# Altium footprint library Connector.PcbLib: 231 footprints (part 10 of 15)
Each footprint in its own frame and in the unit in brackets; x right, y up, seen from the top. Pads: shape width x height; smd on the part's side, far side on the other; paste and mask are expansions set on the pad; w line width, h text height; cw(c..) or ccw(c..) is an arc to the next point about the centre after c.
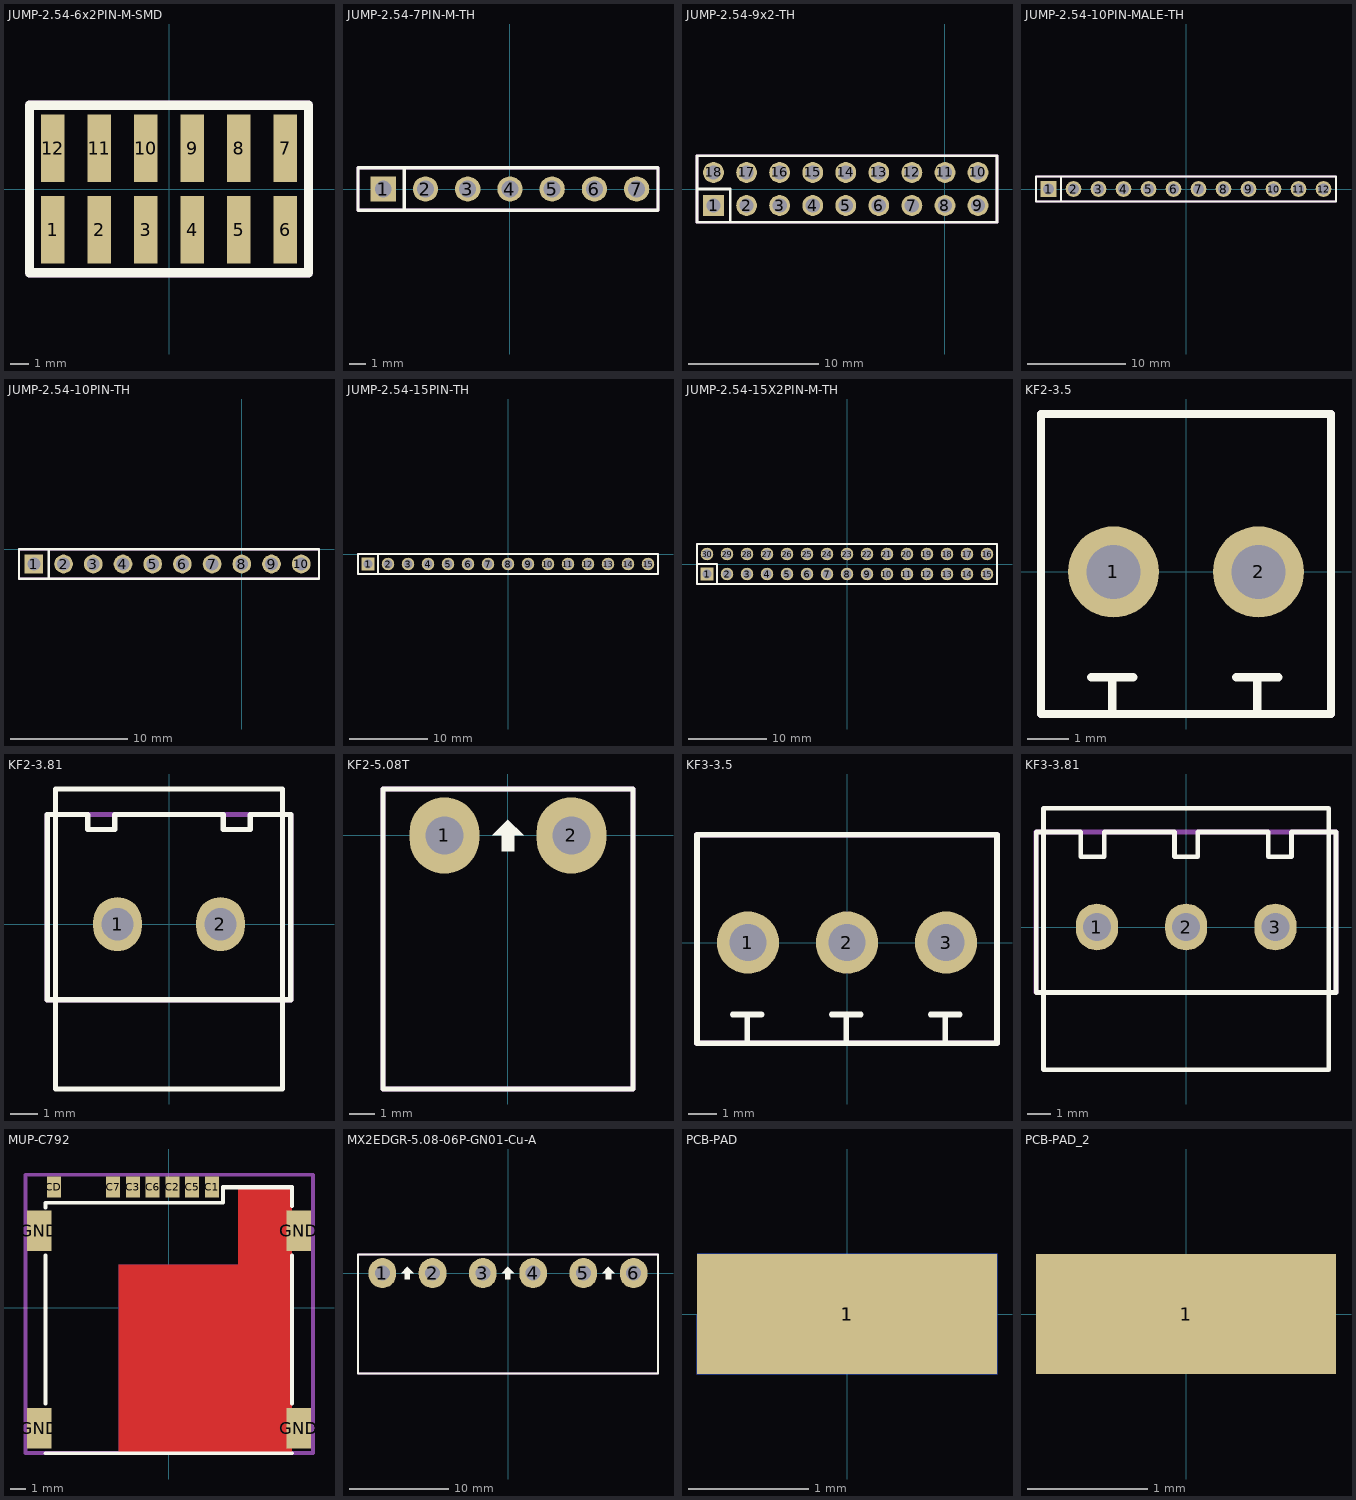
[diagram p9: the footprints below, top view; thin cyan lines are the x and y axes]

## JUMP-2.54-6x2PIN-M-SMD [mm]
pads (12):
  rect 1.27x3.68 smd: 1(-6.35,-2.22) 2(-3.81,-2.22) 3(-1.27,-2.22) 4(1.27,-2.22) 5(3.81,-2.22) 6(6.35,-2.22) 7(6.35,2.22) 8(3.81,2.22) 9(1.27,2.22) 10(-1.27,2.22) 11(-3.81,2.22) 12(-6.35,2.22)
Top Overlay:
  lines w0.5: -7.62,3.048 -7.62,4.572 7.62,4.572 7.62,-4.572 -7.62,-4.572 -7.62,3.493
Mechanical 13:
  lines w0.5: -7.62,3.048 -7.62,4.572 7.62,4.572 7.62,-4.572 -7.62,-4.572 -7.62,3.493
  text ".Designator" at -4.318,-0.508 h2
Mechanical 15:
  lines w0.5: -7.62,3.048 -7.62,4.572 7.62,4.572 7.62,-4.572 -7.62,-4.572 -7.62,3.493
  text ".Comment" at -3.048,-0.508 h2
3D body "015910120.stp": height 9.64, standoff -0.01, extent -7.62,-3.493 7.62,3.493

## JUMP-2.54-7PIN-M-TH [mm] "6 row, straight, gold plating"
height 8.5
pads (7):
  rect 1.52x1.52 hole 1.02: 1(-7.62,0)
  round 1.52 hole 1.02: 2(-5.08,0) 3(-2.54,0) 4(0,0) 5(2.54,0) 6(5.08,0) 7(7.62,0)
Top Overlay:
  lines w0.2: -6.35,-1.27 -6.35,1.27 ; -9.14,-1.27 -9.14,1.27 8.905,1.27 8.905,-1.27 -9.14,-1.27
Mechanical 13:
  lines w0.2: -9.14,-1.27 8.905,-1.27 8.905,1.27 -9.14,1.27 -9.14,-1.27
  text ".Designator" at -4.12,-0.25 h1.5
Mechanical 15:
  lines w0.2: -9.14,-1.27 8.905,-1.27 8.905,1.27 -9.14,1.27 -9.14,-1.27
  text ".Comment" at -4.12,-0.25 h1.5

## JUMP-2.54-9x2-TH [mm]
pads (18):
  rect 1.6x1.6 hole 1.1: 1(-17.78,-1.27)
  round 1.6 hole 1.1: 2(-15.24,-1.27) 3(-12.7,-1.27) 4(-10.16,-1.27) 5(-7.62,-1.27) 6(-5.08,-1.27) 7(-2.54,-1.27) 8(0,-1.27) 9(2.54,-1.27) 10(2.54,1.27) 11(0,1.27) 12(-2.54,1.27) 13(-5.08,1.27) 14(-7.62,1.27) 15(-10.16,1.27) 16(-12.7,1.27) 17(-15.24,1.27) 18(-17.78,1.27)
Top Overlay:
  lines w0.2: -19.05,0 -16.51,0 -16.51,-2.54 ; -19.05,-2.54 -19.05,2.54 4,2.54 4,-2.54 -19.05,-2.54
Mechanical 13:
  lines w0.2: -19.05,-2.54 4,-2.54 4,2.54 -19.05,2.54 -19.05,-2.54
  text ".Designator" at -3.81,-0.762 h2
Mechanical 15:
  lines w0.2: -19.05,-2.54 4,-2.54 4,2.54 -19.05,2.54 -19.05,-2.54
  text ".Comment" at -3.81,-0.508 h2

## JUMP-2.54-10PIN-MALE-TH [mm] "12 pins, 1 row, straight, gold plating"
height 8.54
pads (12):
  rect 1.6x1.6 hole 1.1: 1(-13.97,0)
  round 1.6 hole 1.1: 2(-11.43,0) 3(-8.89,0) 4(-6.35,0) 5(-3.81,0) 6(-1.27,0) 7(1.27,0) 8(3.81,0) 9(6.35,0) 10(8.89,0) 11(11.43,0) 12(13.97,0)
Top Overlay:
  lines w0.2: -12.7,-1.27 -12.7,1.27 ; -15.24,-1.27 -15.24,1.27 -13.335,1.27 15.24,1.27 15.24,-1.27 -15.24,-1.27
Mechanical 13:
  lines w0.2: -15.24,-1.27 15.24,-1.27 15.24,1.27 -13.335,1.27 -15.24,1.27 -15.24,-1.27
  text ".Designator" at -3.75,-0.25 h1.5
Mechanical 15:
  lines w0.2: -15.24,-1.27 15.24,-1.27 15.24,1.27 -13.335,1.27 -15.24,1.27 -15.24,-1.27
  text ".Comment" at -3.75,-0.25 h1.5
3D body "61301211121.stp": height 8.54, standoff -3, extent -15.24,-1.27 15.24,1.27

## JUMP-2.54-10PIN-TH [mm]
pads (10):
  rect 1.6x1.6 hole 1.1: 1(-17.78,-1.27)
  round 1.6 hole 1.1: 2(-15.24,-1.27) 3(-12.7,-1.27) 4(-10.16,-1.27) 5(-7.62,-1.27) 6(-5.08,-1.27) 7(-2.54,-1.27) 8(0,-1.27) 9(2.54,-1.27) 10(5.08,-1.27)
Top Overlay:
  lines w0.2: -16.51,-2.54 -16.51,0 -19.05,0 ; -19.05,0 6.6,0 6.6,-2.54 -19.05,-2.54 -19.05,0
Mechanical 13:
  lines w0.2: -19.05,-2.54 -19.05,0 6.6,0 6.6,-2.54 -19.05,-2.54
  text ".Designator" at -19.05,0 h2
Mechanical 15:
  lines w0.2: -19.05,-2.54 -19.05,0 6.6,0 6.6,-2.54 -19.05,-2.54
  text ".Comment" at -19,0.5 h2

## JUMP-2.54-15PIN-TH [mm]
pads (15):
  rect 1.6x1.6 hole 1.1: 1(-17.78,-1.27)
  round 1.6 hole 1.1: 2(-15.24,-1.27) 3(-12.7,-1.27) 4(-10.16,-1.27) 5(-7.62,-1.27) 6(-5.08,-1.27) 7(-2.54,-1.27) 8(0,-1.27) 9(2.54,-1.27) 10(5.08,-1.27) 11(7.62,-1.27) 12(10.16,-1.27) 13(12.7,-1.27) 14(15.24,-1.27) 15(17.78,-1.27)
Top Overlay:
  lines w0.2: -16.51,-2.54 -16.51,0 -19.05,0 ; -19.05,0 19.05,0 19.05,-2.54 -19.05,-2.54 -19.05,0
Mechanical 13:
  lines w0.2: -19.05,-2.54 -19.05,0 19.05,0 19.05,-2.54 -19.05,-2.54
  text ".Designator" at -3.81,-0.762 h2
Mechanical 15:
  lines w0.2: -19.05,-2.54 -19.05,0 19.05,0 19.05,-2.54 -19.05,-2.54
  text ".Comment" at -3.81,-0.508 h2

## JUMP-2.54-15X2PIN-M-TH [mm]
pads (30):
  rect 1.6x1.6 hole 1.1: 1(-17.78,-1.27)
  round 1.6 hole 1.1: 2(-15.24,-1.27) 3(-12.7,-1.27) 4(-10.16,-1.27) 5(-7.62,-1.27) 6(-5.08,-1.27) 7(-2.54,-1.27) 8(0,-1.27) 9(2.54,-1.27) 10(5.08,-1.27) 11(7.62,-1.27) 12(10.16,-1.27) 13(12.7,-1.27) 14(15.24,-1.27) 15(17.78,-1.27) 16(17.78,1.27) 17(15.24,1.27) 18(12.7,1.27) 19(10.16,1.27) 20(7.62,1.27) 21(5.08,1.27) 22(2.54,1.27) 23(0,1.27) 24(-2.54,1.27) 25(-5.08,1.27) 26(-7.62,1.27) 27(-10.16,1.27) 28(-12.7,1.27) 29(-15.24,1.27) 30(-17.78,1.27)
Top Overlay:
  lines w0.2: -19.05,0 -16.51,0 -16.51,-2.54 ; -19.05,-2.54 19.05,-2.54 19.05,2.54 -19.05,2.54 -19.05,-2.54
Mechanical 13:
  lines w0.2: -19.05,-2.54 -19.05,2.54 19.05,2.54 19.05,-2.54 -19.05,-2.54
  text ".Designator" at -3.81,-0.762 h2
Mechanical 15:
  lines w0.2: -19.05,-2.54 -19.05,2.54 19.05,2.54 19.05,-2.54 -19.05,-2.54
  text ".Comment" at -3.81,-0.508 h2
3D body "61303021121.stp": height 8.55, standoff -2.99, extent -19.05,-2.54 19.05,2.54

## KF2-3.5 [mm] "3,50mm - modular - blue - Horizontal wire entry - Pressure clamp - 8,4mm height - 02p"
height 8.4
pads (2):
  round 2.2 hole 1.3: 1(-1.75,0) 2(1.75,0)
Top Overlay:
  lines w0.2: -2.286,-2.54 -1.27,-2.54 ; -1.778,-3.429 -1.778,-2.54 ; 1.214,-2.54 2.23,-2.54 ; 1.722,-3.429 1.722,-2.54 ; -3.5,-3.429 -3.5,3.81 3.5,3.81 3.5,-3.429 -3.5,-3.429
Mechanical 13:
  lines w0.2: -3.5,-3.429 3.5,-3.429 3.5,3.81 -3.5,3.81 -3.5,-3.429
  text ".Designator" at -3.048,-0.381 h1.5
Mechanical 15:
  lines w0.2: -3.5,-3.429 3.5,-3.429 3.5,3.81 -3.5,3.81 -3.5,-3.429
  text ".Comment" at -2.794,-0.127 h1.5
3D body "393570002.stp": height 8.51, standoff -3.51, extent -3.556,-3.48 3.556,3.81

## KF2-3.81 [mm]
pads (2):
  oval 1.8x2 hole 1.2: 1(-1.905,0) 2(1.905,0)
Top Overlay:
  lines w0.2: -4.509,-2.8 4.509,-2.8 4.509,4.058 3,4.058 3,3.5 2,3.5 2,4.058 -2,4.058 -2,3.5 -3,3.5 -3,4.058 -4.509,4.058 -4.509,-2.8 ; -4.2,-6.1 4.2,-6.1 4.2,5 -4.2,5 -4.2,-6.1
Mechanical 13:
  lines w0.2: -4.509,-2.8 -4.509,4.058 4.509,4.058 4.509,-2.8 -4.509,-2.8
  text ".Designator" at -3.3,-0.3 h1.5
Mechanical 15:
  lines w0.2: -4.509,-2.8 -4.509,4.058 4.509,4.058 4.509,-2.8 -4.509,-2.8
  text ".Comment" at -3.3,-0.3 h1.5
3D body "395116002.stp": height 9.5, standoff -3.2, extent -4.509,-2.8 4.509,4.058
3D body "395105002.stp": height 19.51, standoff 3.51, extent -4.191,-6.1 4.191,5.076

## KF2-5.08T [mil] "Header 2, 2 pin, hight 300mil, Pin to Pin 200, Colour Green"
height 300
pads (2):
  oval 110x120 hole 60: 1(-100,0) 2(100,0)
Top Overlay:
  region: 0,25 -25,0 -10,0 -10,-25 10,-25 10,0 25,0
  lines w7.87: -196.7,-399.22 -196.7,73.22 197,73.22 197,-399.22 -196.7,-399.22
Mechanical 13:
  lines w7.87: -196.7,-399.22 197,-399.22 197,73.22 -196.7,73.22 -196.7,-399.22
Mechanical 15:
  lines w7.87: -196.7,-399.22 -196.7,73.22 197,73.22 197,-399.22 -196.7,-399.22
3D body "SW3dPS-5EHDR_2P.STEP": height 333.51, standoff -157.48, extent -196.7,-399.22 197,73.22

## KF3-3.5 [mm] "3,50mm - modular - blue - Horizontal wire entry - Pressure clamp - 8,4mm height - 03p"
height 8.4
pads (3):
  round 2.2 hole 1.3: 1(-3.5,0) 2(0,0) 3(3.5,0)
Top Overlay:
  lines w0.2: -4.036,-2.54 -3.02,-2.54 ; -3.528,-3.429 -3.528,-2.54 ; -0.536,-2.54 0.48,-2.54 ; -0.028,-3.429 -0.028,-2.54 ; 2.964,-2.54 3.98,-2.54 ; 3.472,-3.429 3.472,-2.54 ; -5.3,-3.556 5.3,-3.556 5.3,3.81 -5.3,3.81 -5.3,-3.556
Mechanical 13:
  lines w0.2: -5.3,-3.556 -5.3,3.81 5.3,3.81 5.3,-3.556 -5.3,-3.556
  text ".Designator" at -3.429,-0.381 h1.5
Mechanical 15:
  lines w0.2: -5.3,-3.556 -5.3,3.81 5.3,3.81 5.3,-3.556 -5.3,-3.556
  text ".Comment" at -3.429,-0.381 h1.5
3D body "393570003.stp": height 8.51, standoff -3.51, extent -5.207,-3.48 5.207,3.81

## KF3-3.81 [mm]
pads (3):
  oval 1.8x2 hole 1.2: 1(-3.81,0) 2(0,0) 3(3.81,0)
Top Overlay:
  lines w0.2: -6.4,-2.8 6.4,-2.8 6.4,4.058 4.5,4.058 4.5,3 3.5,3 3.5,4.058 0.5,4.058 0.5,3 -0.5,3 -0.5,4.058 -3.5,4.058 -3.5,3 -4.5,3 -4.5,4.058 -6.4,4.058 -6.4,-2.8 ; -6.096,-6.1 -6.096,5.076 6.096,5.076 6.096,-6.1 -6.096,-6.1
Mechanical 13:
  lines w0.2: -6.414,-2.8 -6.414,4.058 6.4,4.058 6.4,-2.8 -6.414,-2.8
  text ".Designator" at -3.7,0.2 h1.5
Mechanical 15:
  lines w0.2: -6.414,-2.8 -6.414,4.058 6.4,4.058 6.4,-2.8 -6.414,-2.8
  text ".Comment" at -3.8,0.2 h1.5
3D body "395116003.stp": height 9.5, standoff -3.2, extent -6.413,-2.8 6.413,4.058
3D body "395105003.stp": height 19.51, standoff 3.51, extent -6.096,-6.1 6.096,5.076

## MUP-C792 [mm]
pads (11):
  rect 0.9x1.35 smd: C1(2.76,7.753) C2(0.22,7.753) C3(-2.32,7.753) C5(1.49,7.753) C6(-1.05,7.753) C7(-3.59,7.753) CD(-7.4,7.753)
  rect 1.56x2.61 smd: GND(-8.34,-7.752) GND(-8.34,4.948) GND(8.34,-7.752) GND(8.34,4.948)
Top Layer:
  pour cut-out: 4.46,7.748 7.895,7.753 7.895,-9.347 -3.24,-9.352 -3.24,2.653 -3.24,2.753 4.46,2.753
Bottom Layer:
  pour cut-out: 4.46,7.748 7.895,7.753 7.895,-9.347 -3.24,-9.352 -3.24,2.653 -3.24,2.753 4.46,2.753
Top Overlay:
  lines w0.254: -7.94,-6.147 -7.94,3.353 ; -7.94,6.453 -7.94,6.753 3.46,6.753 3.46,7.753 ; 3.46,6.853 3.46,7.753 ; 7.9,-6.147 7.9,3.353 ; 7.9,6.553 7.9,7.748 ; 3.46,7.753 3.465,7.748 7.9,7.748 ; 3.46,7.753 7.895,7.753 7.9,7.748 ; -7.94,-9.352 -7,-9.352 7.9,-9.352 -7.94,-9.352
Mechanical 13:
  lines w0.254: -9.24,-9.347 9.26,-9.347 9.26,8.553 -9.24,8.553 -9.24,-9.347
  text ".Designator" at -8.44,-1.747 h4.5
Mechanical 15:
  lines w0.254: -9.24,-9.347 -9.24,8.553 9.26,8.553 9.26,-9.347 -9.24,-9.347
  text ".Comment" at -8.44,-1.747 h4.5
3D body: height 1.38, standoff 0, extent 3.46,7.748 7.9,7.753
3D body "C792-2 6P Without Post.stp": height 1.58, standoff 0.02, extent -8.375,-9.327 8.375,8.003

## MX2EDGR-5.08-06P-GN01-Cu-A [mil]
pads (6):
  oval 110x120 hole 60: 1(-500.16,0) 2(-300.16,0) 3(-100.16,0) 4(99.84,0) 5(299.84,0) 6(499.84,0)
Top Overlay:
  region: -400.16,25 -425.16,0 -410.16,0 -410.16,-25 -390.16,-25 -390.16,0 -375.16,0
  region: -0.16,25 -25.16,0 -10.16,0 -10.16,-25 9.84,-25 9.84,0 24.84,0
  region: 399.84,25 374.84,0 389.84,0 389.84,-25 409.84,-25 409.84,0 424.84,0
  lines w7.87: -596.86,-399.22 -596.86,73.22 596.84,73.22 596.84,-399.22 -596.86,-399.22
Mechanical 13:
  lines w7.87: -596.86,-399.22 596.84,-399.22 596.84,73.22 -596.86,73.22 -596.86,-399.22
Mechanical 15:
  lines w7.87: -203.16,-399.22 -596.86,-399.22 -596.86,73.22 -203.16,73.22 ; 596.84,-399.22 596.84,73.22
3D body "SW3dPS-5EHDR_2P.STEP": height 333.51, standoff -157.48, extent -596.86,-399.22 -203.16,73.22
3D body "SW3dPS-5EHDR_2P.STEP": height 333.51, standoff -157.48, extent -196.86,-399.22 196.84,73.22
3D body "SW3dPS-5EHDR_2P.STEP": height 333.51, standoff -157.48, extent 203.14,-399.22 596.84,73.22

## PCB-PAD [mm]
pads (2):
  rect 2.5x1 smd: 1(0,0)
  rect 2.5x1 smd far side: 1(0,0)

## PCB-PAD_2 [mm]
pads (1):
  rect 2.5x1 smd: 1(0,0)